# Altium schematic symbol library Regulator_Switching.SchLib: 1070 symbols (part 2 of 9)
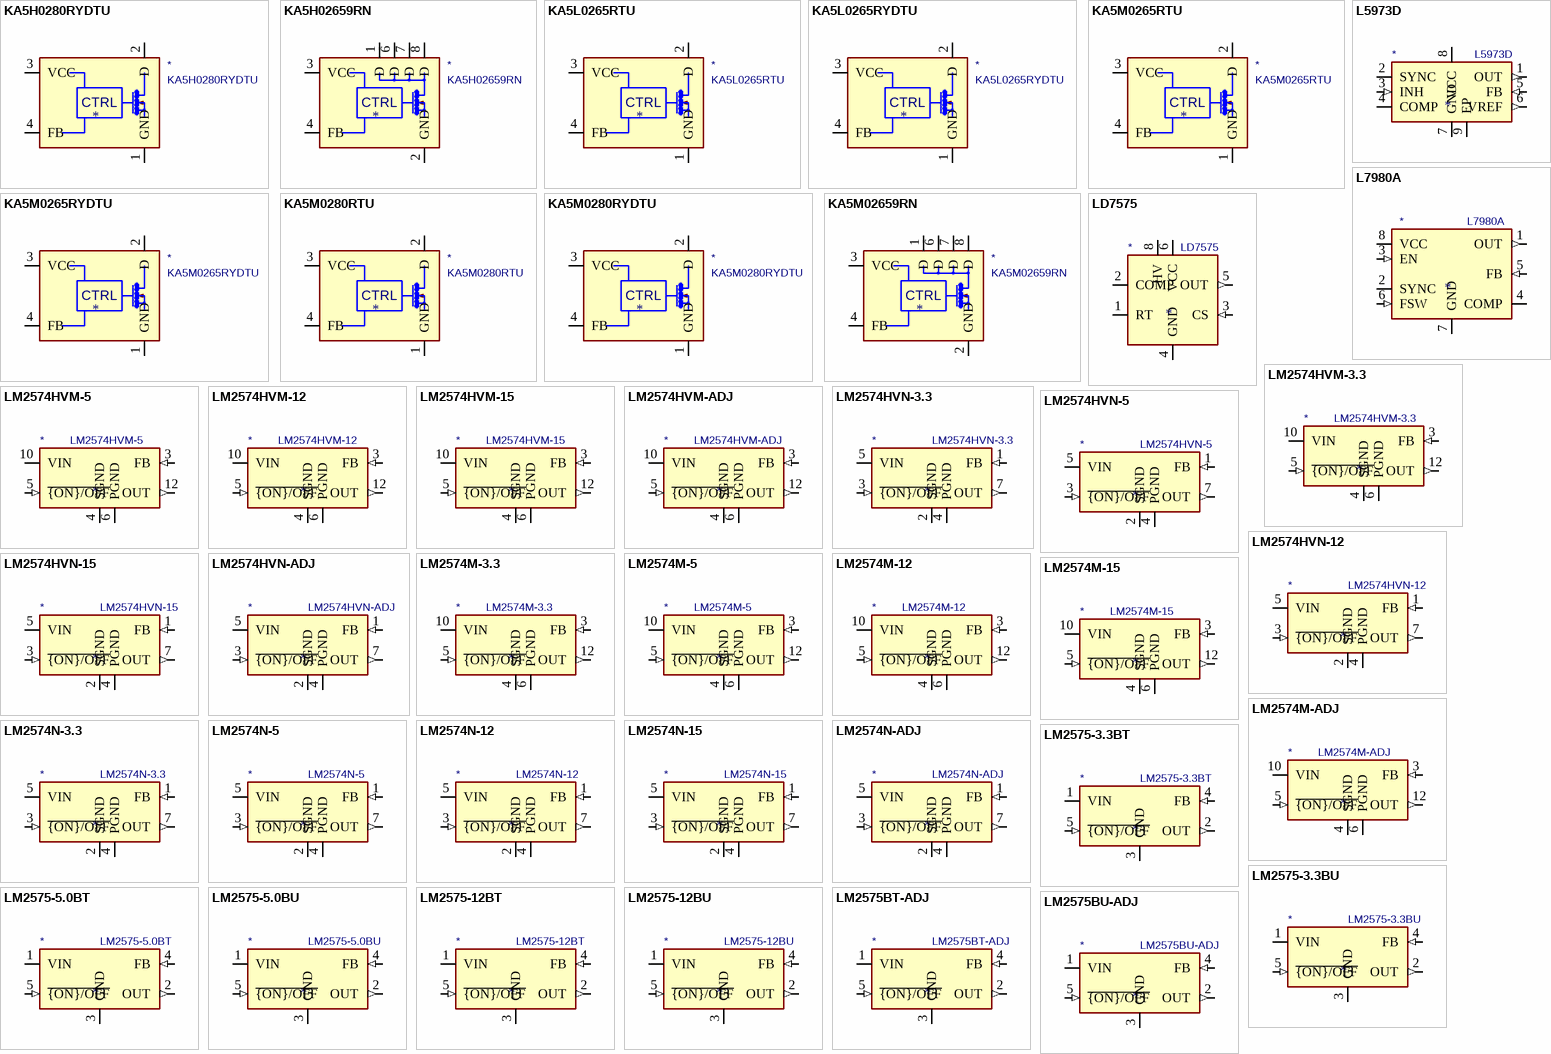
[diagram p27: symbols KA5H0280RYDTU to LM2575BU-ADJ]

## LM2574M-12
designator *  value LM2574M-12
ki_keywords: Step-Down Voltage Regulator 12V 500mA; ki_description: 12V, 0.5A SIMPLE SWITCHER® Step-Down Voltage Regulator, SO-8; ki_fp_filters: SOIC*7.5x9mm*P1.27mm*; Footprint: Package_SO:SOIC-14W_7.5x9mm_P1.27mm; Supplier: http://www.national.com/ds/LM/LM2574.pdf
footprint SOIC-14W_7.5x9mm_P1.27mm
pins: 3 FB (in), 4 SGND (power), 5 ~{{ON}/OFF} (in), 6 PGND (power), 10 VIN (power), 12 OUT (out)

## LM2574M-15
designator *  value LM2574M-15
ki_keywords: Step-Down Voltage Regulator 15V 500mA; ki_description: 15V, 0.5A SIMPLE SWITCHER® Step-Down Voltage Regulator, SO-8; ki_fp_filters: SOIC*7.5x9mm*P1.27mm*; Footprint: Package_SO:SOIC-14W_7.5x9mm_P1.27mm; Supplier: http://www.national.com/ds/LM/LM2574.pdf
footprint SOIC-14W_7.5x9mm_P1.27mm
pins: 3 FB (in), 4 SGND (power), 5 ~{{ON}/OFF} (in), 6 PGND (power), 10 VIN (power), 12 OUT (out)

## LM2574M-ADJ
designator *  value LM2574M-ADJ
ki_keywords: Step-Down Voltage Regulator Adjustable 500mA; ki_description: Adjustable Output Voltage, 0.5A SIMPLE SWITCHER® Step-Down Voltage Regulator, SO-8; ki_fp_filters: SOIC*7.5x9mm*P1.27mm*; Footprint: Package_SO:SOIC-14W_7.5x9mm_P1.27mm; Supplier: http://www.national.com/ds/LM/LM2574.pdf
footprint SOIC-14W_7.5x9mm_P1.27mm
pins: 3 FB (in), 4 SGND (power), 5 ~{{ON}/OFF} (in), 6 PGND (power), 10 VIN (power), 12 OUT (out)

## LM2574N-3.3
designator *  value LM2574N-3.3
ki_keywords: Step-Down Voltage Regulator 3.3V 500mA; ki_description: 3.3V, 0.5A SIMPLE SWITCHER® Step-Down Voltage Regulator, DIP-8; ki_fp_filters: DIP*W7.62mm*; Footprint: Package_DIP:DIP-8_W7.62mm; Supplier: http://www.national.com/ds/LM/LM2574.pdf
footprint DIP-8_W7.62mm
pins: 1 FB (in), 2 SGND (power), 3 ~{{ON}/OFF} (in), 4 PGND (power), 5 VIN (power), 6 NC (in) hidden, 7 OUT (out), 8 NC (in) hidden

## LM2574N-5
designator *  value LM2574N-5
ki_keywords: Step-Down Voltage Regulator 5V 500mA; ki_description: 5V, 0.5A SIMPLE SWITCHER® Step-Down Voltage Regulator, DIP-8; ki_fp_filters: DIP*W7.62mm*; Footprint: Package_DIP:DIP-8_W7.62mm; Supplier: http://www.national.com/ds/LM/LM2574.pdf
footprint DIP-8_W7.62mm
pins: 1 FB (in), 2 SGND (power), 3 ~{{ON}/OFF} (in), 4 PGND (power), 5 VIN (power), 6 NC (in) hidden, 7 OUT (out), 8 NC (in) hidden

## LM2574N-12
designator *  value LM2574N-12
ki_keywords: Step-Down Voltage Regulator 12V 500mA; ki_description: 12V, 0.5A SIMPLE SWITCHER® Step-Down Voltage Regulator, DIP-8; ki_fp_filters: DIP*W7.62mm*; Footprint: Package_DIP:DIP-8_W7.62mm; Supplier: http://www.national.com/ds/LM/LM2574.pdf
footprint DIP-8_W7.62mm
pins: 1 FB (in), 2 SGND (power), 3 ~{{ON}/OFF} (in), 4 PGND (power), 5 VIN (power), 6 NC (in) hidden, 7 OUT (out), 8 NC (in) hidden

## LM2574N-15
designator *  value LM2574N-15
ki_keywords: Step-Down Voltage Regulator 15V 500mA; ki_description: 15V, 0.5A SIMPLE SWITCHER® Step-Down Voltage Regulator, DIP-8; ki_fp_filters: DIP*W7.62mm*; Footprint: Package_DIP:DIP-8_W7.62mm; Supplier: http://www.national.com/ds/LM/LM2574.pdf
footprint DIP-8_W7.62mm
pins: 1 FB (in), 2 SGND (power), 3 ~{{ON}/OFF} (in), 4 PGND (power), 5 VIN (power), 6 NC (in) hidden, 7 OUT (out), 8 NC (in) hidden

## LM2574N-ADJ
designator *  value LM2574N-ADJ
ki_keywords: Step-Down Voltage Regulator Adjustable 500mA; ki_description: Adjustable Output Voltage, 0.5A SIMPLE SWITCHER® Step-Down Voltage Regulator, DIP-8; ki_fp_filters: DIP*W7.62mm*; Footprint: Package_DIP:DIP-8_W7.62mm; Supplier: http://www.national.com/ds/LM/LM2574.pdf
footprint DIP-8_W7.62mm
pins: 1 FB (in), 2 SGND (power), 3 ~{{ON}/OFF} (in), 4 PGND (power), 5 VIN (power), 6 NC (in) hidden, 7 OUT (out), 8 NC (in) hidden

## LM2575-3.3BT
designator *  value LM2575-3.3BT
ki_keywords: Buck regulator Switcher; ki_description: Fixed 3.3V 52kHz Simple 1A Buck Regulator, TO-220-5; ki_fp_filters: TO?220*; Footprint: Package_TO_SOT_THT:TO-220-5_Vertical; Supplier: http://ww1.microchip.com/downloads/en/DeviceDoc/lm2575.pdf
footprint TO-220-5_Vertical
pins: 1 VIN (power), 2 OUT (out), 3 GND (power), 4 FB (in), 5 ~{{ON}/OFF} (in)

## LM2575-3.3BU
designator *  value LM2575-3.3BU
ki_keywords: Buck regulator Switcher; ki_description: Fixed 3.3V 52kHz Simple 1A Buck Regulator, TO-263; ki_fp_filters: TO?263*; Footprint: Package_TO_SOT_SMD:TO-263-5_TabPin3; Supplier: http://ww1.microchip.com/downloads/en/DeviceDoc/lm2575.pdf
footprint TO-263-5_TabPin3
pins: 1 VIN (power), 2 OUT (out), 3 GND (power), 4 FB (in), 5 ~{{ON}/OFF} (in)

## LM2575-5.0BT
designator *  value LM2575-5.0BT
ki_keywords: Buck regulator Switcher; ki_description: Fixed 5.0V 52kHz Simple 1A Buck Regulator, TO-220-5; ki_fp_filters: TO?220*; Footprint: Package_TO_SOT_THT:TO-220-5_Vertical; Supplier: http://ww1.microchip.com/downloads/en/DeviceDoc/lm2575.pdf
footprint TO-220-5_Vertical
pins: 1 VIN (power), 2 OUT (out), 3 GND (power), 4 FB (in), 5 ~{{ON}/OFF} (in)

## LM2575-5.0BU
designator *  value LM2575-5.0BU
ki_keywords: Buck regulator Switcher; ki_description: Fixed 5.0V 52kHz Simple 1A Buck Regulator, TO-263; ki_fp_filters: TO?263*; Footprint: Package_TO_SOT_SMD:TO-263-5_TabPin3; Supplier: http://ww1.microchip.com/downloads/en/DeviceDoc/lm2575.pdf
footprint TO-263-5_TabPin3
pins: 1 VIN (power), 2 OUT (out), 3 GND (power), 4 FB (in), 5 ~{{ON}/OFF} (in)

## LM2575-12BT
designator *  value LM2575-12BT
ki_keywords: Buck regulator Switcher; ki_description: Fixed 12V 52kHz Simple 1A Buck Regulator, TO-220-5; ki_fp_filters: TO?220*; Footprint: Package_TO_SOT_THT:TO-220-5_Vertical; Supplier: http://ww1.microchip.com/downloads/en/DeviceDoc/lm2575.pdf
footprint TO-220-5_Vertical
pins: 1 VIN (power), 2 OUT (out), 3 GND (power), 4 FB (in), 5 ~{{ON}/OFF} (in)

## LM2575-12BU
designator *  value LM2575-12BU
ki_keywords: Buck regulator Switcher; ki_description: Fixed 12V 52kHz Simple 1A Buck Regulator, TO-263; ki_fp_filters: TO?263*; Footprint: Package_TO_SOT_SMD:TO-263-5_TabPin3; Supplier: http://ww1.microchip.com/downloads/en/DeviceDoc/lm2575.pdf
footprint TO-263-5_TabPin3
pins: 1 VIN (power), 2 OUT (out), 3 GND (power), 4 FB (in), 5 ~{{ON}/OFF} (in)

## LM2575BT-ADJ
designator *  value LM2575BT-ADJ
ki_keywords: Buck regulator Switcher; ki_description: Adjustable 52kHz Simple 1A Buck Regulator, TO-220-5; ki_fp_filters: TO?220*; Footprint: Package_TO_SOT_THT:TO-220-5_Vertical; Supplier: http://ww1.microchip.com/downloads/en/DeviceDoc/lm2575.pdf
footprint TO-220-5_Vertical
pins: 1 VIN (power), 2 OUT (out), 3 GND (power), 4 FB (in), 5 ~{{ON}/OFF} (in)

## LM2575BU-ADJ
designator *  value LM2575BU-ADJ
ki_keywords: Buck Regulator Switcher; ki_description: Adjustable 52kHz Simple 1A Buck Regulator, TO-263; ki_fp_filters: TO?263*; Footprint: Package_TO_SOT_SMD:TO-263-5_TabPin3; Supplier: http://ww1.microchip.com/downloads/en/DeviceDoc/lm2575.pdf
footprint TO-263-5_TabPin3
pins: 1 VIN (power), 2 OUT (out), 3 GND (power), 4 FB (in), 5 ~{{ON}/OFF} (in)

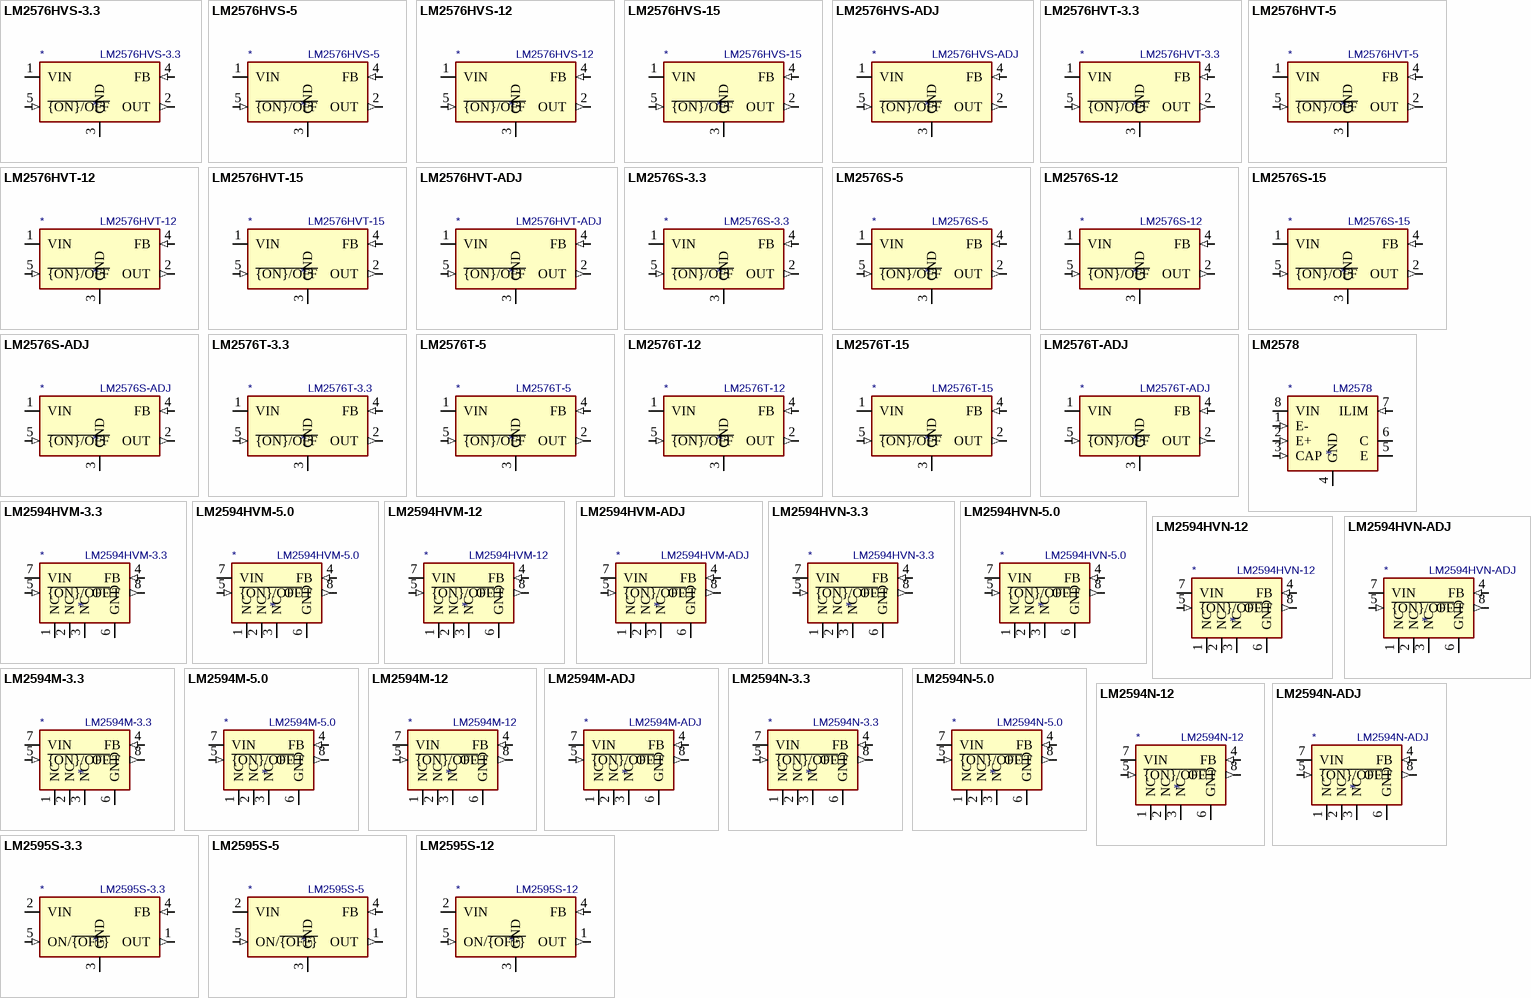
[diagram p4: symbols LM2576HVS-3.3 to LM2595S-12]

## LM2576HVS-3.3
designator *  value LM2576HVS-3.3
ki_keywords: Step-Down Voltage Regulator 3.3V 3A High Voltage; ki_description: 3.3V, 3A, SIMPLE SWITCHER® Step-Down Voltage Regulator, High Voltage Input, TO-263; ki_fp_filters: TO?263*; Footprint: Package_TO_SOT_SMD:TO-263-5_TabPin3; Supplier: http://www.ti.com/lit/ds/symlink/lm2576.pdf
footprint TO-263-5_TabPin3
pins: 1 VIN (power), 2 OUT (out), 3 GND (power), 4 FB (in), 5 ~{{ON}/OFF} (in)

## LM2576HVS-5
designator *  value LM2576HVS-5
ki_keywords: Step-Down Voltage Regulator 5V 3A High Voltage; ki_description: 5V 3A, SIMPLE SWITCHER® Step-Down Voltage Regulator, High Voltage Input, TO-263; ki_fp_filters: TO?263*; Footprint: Package_TO_SOT_SMD:TO-263-5_TabPin3; Supplier: http://www.ti.com/lit/ds/symlink/lm2576.pdf
footprint TO-263-5_TabPin3
pins: 1 VIN (power), 2 OUT (out), 3 GND (power), 4 FB (in), 5 ~{{ON}/OFF} (in)

## LM2576HVS-12
designator *  value LM2576HVS-12
ki_keywords: Step-Down Voltage Regulator 12V 3A High Voltage; ki_description: 12V, 3A SIMPLE SWITCHER® Step-Down Voltage Regulator, High Voltage Input, TO-263; ki_fp_filters: TO?263*; Footprint: Package_TO_SOT_SMD:TO-263-5_TabPin3; Supplier: http://www.ti.com/lit/ds/symlink/lm2576.pdf
footprint TO-263-5_TabPin3
pins: 1 VIN (power), 2 OUT (out), 3 GND (power), 4 FB (in), 5 ~{{ON}/OFF} (in)

## LM2576HVS-15
designator *  value LM2576HVS-15
ki_keywords: Step-Down Voltage Regulator 15V 3A High Voltage; ki_description: 15V, 3A SIMPLE SWITCHER® Step-Down Voltage Regulator, High Voltage Input, TO-263; ki_fp_filters: TO?263*; Footprint: Package_TO_SOT_SMD:TO-263-5_TabPin3; Supplier: http://www.ti.com/lit/ds/symlink/lm2576.pdf
footprint TO-263-5_TabPin3
pins: 1 VIN (power), 2 OUT (out), 3 GND (power), 4 FB (in), 5 ~{{ON}/OFF} (in)

## LM2576HVS-ADJ
designator *  value LM2576HVS-ADJ
ki_keywords: Step-Down Voltage Regulator 3A Adjustable High Voltage; ki_description: Adjustable Output Voltage, 3A SIMPLE SWITCHER® Step-Down Voltage Regulator, High Voltage Input, TO-263; ki_fp_filters: TO?263*; Footprint: Package_TO_SOT_SMD:TO-263-5_TabPin3; Supplier: http://www.ti.com/lit/ds/symlink/lm2576.pdf
footprint TO-263-5_TabPin3
pins: 1 VIN (power), 2 OUT (out), 3 GND (power), 4 FB (in), 5 ~{{ON}/OFF} (in)

## LM2576HVT-3.3
designator *  value LM2576HVT-3.3
ki_keywords: Step-Down Voltage Regulator 3.3V 3A High Voltage; ki_description: 3.3V, 3A SIMPLE SWITCHER® Step-Down Voltage Regulator, High Voltage Input, TO-220-5; ki_fp_filters: TO?220*; Footprint: Package_TO_SOT_THT:TO-220-5_Vertical; Supplier: http://www.ti.com/lit/ds/symlink/lm2576.pdf
footprint TO-220-5_Vertical
pins: 1 VIN (power), 2 OUT (out), 3 GND (power), 4 FB (in), 5 ~{{ON}/OFF} (in)

## LM2576HVT-5
designator *  value LM2576HVT-5
ki_keywords: Step-Down Voltage Regulator 5V 3A High Voltage; ki_description: 5V, 3A SIMPLE SWITCHER® Step-Down Voltage Regulator, High Voltage Input, TO-220-5; ki_fp_filters: TO?220*; Footprint: Package_TO_SOT_THT:TO-220-5_Vertical; Supplier: http://www.ti.com/lit/ds/symlink/lm2576.pdf
footprint TO-220-5_Vertical
pins: 1 VIN (power), 2 OUT (out), 3 GND (power), 4 FB (in), 5 ~{{ON}/OFF} (in)

## LM2576HVT-12
designator *  value LM2576HVT-12
ki_keywords: Step-Down Voltage Regulator 12V 3A High Voltage; ki_description: 12V, 3A SIMPLE SWITCHER® Step-Down Voltage Regulator, High Voltage Input, TO-220-5; ki_fp_filters: TO?220*; Footprint: Package_TO_SOT_THT:TO-220-5_Vertical; Supplier: http://www.ti.com/lit/ds/symlink/lm2576.pdf
footprint TO-220-5_Vertical
pins: 1 VIN (power), 2 OUT (out), 3 GND (power), 4 FB (in), 5 ~{{ON}/OFF} (in)

## LM2576HVT-15
designator *  value LM2576HVT-15
ki_keywords: Step-Down Voltage Regulator 15V 3A High Voltage; ki_description: 15V, 3A SIMPLE SWITCHER® Step-Down Voltage Regulator, High Voltage Input, TO-220-5; ki_fp_filters: TO?220*; Footprint: Package_TO_SOT_THT:TO-220-5_Vertical; Supplier: http://www.ti.com/lit/ds/symlink/lm2576.pdf
footprint TO-220-5_Vertical
pins: 1 VIN (power), 2 OUT (out), 3 GND (power), 4 FB (in), 5 ~{{ON}/OFF} (in)

## LM2576HVT-ADJ
designator *  value LM2576HVT-ADJ
ki_keywords: Step-Down Voltage Regulator 3A Adjustable High Voltage; ki_description: Adjustable Output Voltage, 3A SIMPLE SWITCHER® Step-Down Voltage Regulator, High Voltage Input, TO-220-5; ki_fp_filters: TO?220*; Footprint: Package_TO_SOT_THT:TO-220-5_Vertical; Supplier: http://www.ti.com/lit/ds/symlink/lm2576.pdf
footprint TO-220-5_Vertical
pins: 1 VIN (power), 2 OUT (out), 3 GND (power), 4 FB (in), 5 ~{{ON}/OFF} (in)

## LM2576S-3.3
designator *  value LM2576S-3.3
ki_keywords: Step-Down Voltage Regulator 3.3V 3A; ki_description: 3.3V, 3A SIMPLE SWITCHER® Step-Down Voltage Regulator, TO-263; ki_fp_filters: TO?263*; Footprint: Package_TO_SOT_SMD:TO-263-5_TabPin3; Supplier: http://www.ti.com/lit/ds/symlink/lm2576.pdf
footprint TO-263-5_TabPin3
pins: 1 VIN (power), 2 OUT (out), 3 GND (power), 4 FB (in), 5 ~{{ON}/OFF} (in)

## LM2576S-5
designator *  value LM2576S-5
ki_keywords: Step-Down Voltage Regulator 5V 3A; ki_description: 5V, 3A SIMPLE SWITCHER® Step-Down Voltage Regulator, TO-263; ki_fp_filters: TO?263*; Footprint: Package_TO_SOT_SMD:TO-263-5_TabPin3; Supplier: http://www.ti.com/lit/ds/symlink/lm2576.pdf
footprint TO-263-5_TabPin3
pins: 1 VIN (power), 2 OUT (out), 3 GND (power), 4 FB (in), 5 ~{{ON}/OFF} (in)

## LM2576S-12
designator *  value LM2576S-12
ki_keywords: Step-Down Voltage Regulator 12V 3A; ki_description: 12V, 3A SIMPLE SWITCHER® Step-Down Voltage Regulator, TO-263; ki_fp_filters: TO?263*; Footprint: Package_TO_SOT_SMD:TO-263-5_TabPin3; Supplier: http://www.ti.com/lit/ds/symlink/lm2576.pdf
footprint TO-263-5_TabPin3
pins: 1 VIN (power), 2 OUT (out), 3 GND (power), 4 FB (in), 5 ~{{ON}/OFF} (in)

## LM2576S-15
designator *  value LM2576S-15
ki_keywords: Step-Down Voltage Regulator 15V 3A; ki_description: 15V, 3A SIMPLE SWITCHER® Step-Down Voltage Regulator, TO-263; ki_fp_filters: TO?263*; Footprint: Package_TO_SOT_SMD:TO-263-5_TabPin3; Supplier: http://www.ti.com/lit/ds/symlink/lm2576.pdf
footprint TO-263-5_TabPin3
pins: 1 VIN (power), 2 OUT (out), 3 GND (power), 4 FB (in), 5 ~{{ON}/OFF} (in)

## LM2576S-ADJ
designator *  value LM2576S-ADJ
ki_keywords: Step-Down Voltage Regulator 3A Adjustable; ki_description: Adjustable Output Voltage, 3A SIMPLE SWITCHER® Step-Down Voltage Regulator, TO-263; ki_fp_filters: TO?263*; Footprint: Package_TO_SOT_SMD:TO-263-5_TabPin3; Supplier: http://www.ti.com/lit/ds/symlink/lm2576.pdf
footprint TO-263-5_TabPin3
pins: 1 VIN (power), 2 OUT (out), 3 GND (power), 4 FB (in), 5 ~{{ON}/OFF} (in)

## LM2576T-3.3
designator *  value LM2576T-3.3
ki_keywords: Step-Down Voltage Regulator 3.3V 3A; ki_description: 3.3V, 3A SIMPLE SWITCHER® Step-Down Voltage Regulator, TO-220-5; ki_fp_filters: TO?220*; Footprint: Package_TO_SOT_THT:TO-220-5_Vertical; Supplier: http://www.ti.com/lit/ds/symlink/lm2576.pdf
footprint TO-220-5_Vertical
pins: 1 VIN (power), 2 OUT (out), 3 GND (power), 4 FB (in), 5 ~{{ON}/OFF} (in)

## LM2576T-5
designator *  value LM2576T-5
ki_keywords: Step-Down Voltage Regulator 5V 3A; ki_description: 5V, 3A SIMPLE SWITCHER® Step-Down Voltage Regulator, TO-220-5; ki_fp_filters: TO?220*; Footprint: Package_TO_SOT_THT:TO-220-5_Vertical; Supplier: http://www.ti.com/lit/ds/symlink/lm2576.pdf
footprint TO-220-5_Vertical
pins: 1 VIN (power), 2 OUT (out), 3 GND (power), 4 FB (in), 5 ~{{ON}/OFF} (in)

## LM2576T-12
designator *  value LM2576T-12
ki_keywords: Step-Down Voltage Regulator 12V 3A; ki_description: 12V, 3A SIMPLE SWITCHER® Step-Down Voltage Regulator, TO-220-5; ki_fp_filters: TO?220*; Footprint: Package_TO_SOT_THT:TO-220-5_Vertical; Supplier: http://www.ti.com/lit/ds/symlink/lm2576.pdf
footprint TO-220-5_Vertical
pins: 1 VIN (power), 2 OUT (out), 3 GND (power), 4 FB (in), 5 ~{{ON}/OFF} (in)

## LM2576T-15
designator *  value LM2576T-15
ki_keywords: Step-Down Voltage Regulator 15V 3A; ki_description: 15V, 3A SIMPLE SWITCHER® Step-Down Voltage Regulator, TO-220-5; ki_fp_filters: TO?220*; Footprint: Package_TO_SOT_THT:TO-220-5_Vertical; Supplier: http://www.ti.com/lit/ds/symlink/lm2576.pdf
footprint TO-220-5_Vertical
pins: 1 VIN (power), 2 OUT (out), 3 GND (power), 4 FB (in), 5 ~{{ON}/OFF} (in)

## LM2576T-ADJ
designator *  value LM2576T-ADJ
ki_keywords: Step-Down Voltage Regulator 3A Adjustable; ki_description: Adjustable Output Voltage, 3A SIMPLE SWITCHER® Step-Down Voltage Regulator, TO-220-5; ki_fp_filters: TO?220*; Footprint: Package_TO_SOT_THT:TO-220-5_Vertical; Supplier: http://www.ti.com/lit/ds/symlink/lm2576.pdf
footprint TO-220-5_Vertical
pins: 1 VIN (power), 2 OUT (out), 3 GND (power), 4 FB (in), 5 ~{{ON}/OFF} (in)

## LM2578
designator *  value LM2578
ki_keywords: switching regulator; ki_description: 750mA, Switching Regulator, adjustable output voltage, DIP-8/SOIC-8; ki_fp_filters: DIP*W7.62mm* SOIC*3.9x4.9mm*; Supplier: http://www.ti.com/lit/ds/symlink/lm3578a.pdf
pins: 1 E- (in), 2 E+ (in), 3 CAP (in), 4 GND (power), 5 E (oe), 6 C (oc), 7 ILIM (in), 8 VIN (power)

## LM2594HVM-3.3
designator *  value LM2594HVM-3.3
ki_keywords: buck converter regulator step-down voltage simple switcher fixed; ki_description: 3.3V, 0.5A SIMPLE SWITCHER® Step-Down Voltage Regulator, Maximum VIN 60V, SOIC-8; ki_fp_filters: SOIC*3.9x4.9mm*; Footprint: Package_SO:SOIC-8_3.9x4.9mm_P1.27mm; Supplier: http://www.ti.com/lit/ds/symlink/lm2594.pdf
footprint SOIC-8_3.9x4.9mm_P1.27mm
pins: 1 NC, 2 NC, 3 NC, 4 FB (in), 5 ~{{ON}/OFF} (in), 6 GND (power), 7 VIN (power), 8 OUT (out)

## LM2594HVM-5.0
designator *  value LM2594HVM-5.0
ki_keywords: buck converter regulator step-down voltage simple switcher fixed; ki_description: 5.0V, 0.5A SIMPLE SWITCHER® Step-Down Voltage Regulator, Maximum VIN 60V, SOIC-8; ki_fp_filters: SOIC*3.9x4.9mm*; Footprint: Package_SO:SOIC-8_3.9x4.9mm_P1.27mm; Supplier: http://www.ti.com/lit/ds/symlink/lm2594.pdf
footprint SOIC-8_3.9x4.9mm_P1.27mm
pins: 1 NC, 2 NC, 3 NC, 4 FB (in), 5 ~{{ON}/OFF} (in), 6 GND (power), 7 VIN (power), 8 OUT (out)

## LM2594HVM-12
designator *  value LM2594HVM-12
ki_keywords: buck converter regulator step-down voltage simple switcher fixed; ki_description: 12V, 0.5A SIMPLE SWITCHER® Step-Down Voltage Regulator, Maximum VIN 60V, SOIC-8; ki_fp_filters: SOIC*3.9x4.9mm*; Footprint: Package_SO:SOIC-8_3.9x4.9mm_P1.27mm; Supplier: http://www.ti.com/lit/ds/symlink/lm2594.pdf
footprint SOIC-8_3.9x4.9mm_P1.27mm
pins: 1 NC, 2 NC, 3 NC, 4 FB (in), 5 ~{{ON}/OFF} (in), 6 GND (power), 7 VIN (power), 8 OUT (out)

## LM2594HVM-ADJ
designator *  value LM2594HVM-ADJ
ki_keywords: buck converter regulator step-down voltage simple switcher adjustable; ki_description: Adjustable Output Voltage, 0.5A SIMPLE SWITCHER® Step-Down Voltage Regulator, Maximum VIN 60V, SOIC-8; ki_fp_filters: SOIC*3.9x4.9mm*; Footprint: Package_SO:SOIC-8_3.9x4.9mm_P1.27mm; Supplier: http://www.ti.com/lit/ds/symlink/lm2594.pdf
footprint SOIC-8_3.9x4.9mm_P1.27mm
pins: 1 NC, 2 NC, 3 NC, 4 FB (in), 5 ~{{ON}/OFF} (in), 6 GND (power), 7 VIN (power), 8 OUT (out)

## LM2594HVN-3.3
designator *  value LM2594HVN-3.3
ki_keywords: buck converter regulator step-down voltage simple switcher fixed; ki_description: 3.3V, 0.5A SIMPLE SWITCHER® Step-Down Voltage Regulator, Maximum VIN 60V, DIP-8; ki_fp_filters: DIP*W7.62mm*; Footprint: Package_DIP:DIP-8_W7.62mm; Supplier: http://www.ti.com/lit/ds/symlink/lm2594.pdf
footprint DIP-8_W7.62mm
pins: 1 NC, 2 NC, 3 NC, 4 FB (in), 5 ~{{ON}/OFF} (in), 6 GND (power), 7 VIN (power), 8 OUT (out)

## LM2594HVN-5.0
designator *  value LM2594HVN-5.0
ki_keywords: buck converter regulator step-down voltage simple switcher fixed; ki_description: 5.0V, 0.5A SIMPLE SWITCHER® Step-Down Voltage Regulator, Maximum VIN 60V, DIP-8; ki_fp_filters: DIP*W7.62mm*; Footprint: Package_DIP:DIP-8_W7.62mm; Supplier: http://www.ti.com/lit/ds/symlink/lm2594.pdf
footprint DIP-8_W7.62mm
pins: 1 NC, 2 NC, 3 NC, 4 FB (in), 5 ~{{ON}/OFF} (in), 6 GND (power), 7 VIN (power), 8 OUT (out)

## LM2594HVN-12
designator *  value LM2594HVN-12
ki_keywords: buck converter regulator step-down voltage simple switcher fixed; ki_description: 12V, 0.5A SIMPLE SWITCHER® Step-Down Voltage Regulator, Maximum VIN 60V, DIP-8; ki_fp_filters: DIP*W7.62mm*; Footprint: Package_DIP:DIP-8_W7.62mm; Supplier: http://www.ti.com/lit/ds/symlink/lm2594.pdf
footprint DIP-8_W7.62mm
pins: 1 NC, 2 NC, 3 NC, 4 FB (in), 5 ~{{ON}/OFF} (in), 6 GND (power), 7 VIN (power), 8 OUT (out)

## LM2594HVN-ADJ
designator *  value LM2594HVN-ADJ
ki_keywords: buck converter regulator step-down voltage simple switcher adjustable; ki_description: Adjustable Output Voltage, 0.5A SIMPLE SWITCHER® Step-Down Voltage Regulator, Maximum VIN 60V, DIP-8; ki_fp_filters: DIP*W7.62mm*; Footprint: Package_DIP:DIP-8_W7.62mm; Supplier: http://www.ti.com/lit/ds/symlink/lm2594.pdf
footprint DIP-8_W7.62mm
pins: 1 NC, 2 NC, 3 NC, 4 FB (in), 5 ~{{ON}/OFF} (in), 6 GND (power), 7 VIN (power), 8 OUT (out)

## LM2594M-3.3
designator *  value LM2594M-3.3
ki_keywords: buck converter regulator step-down voltage simple switcher fixed; ki_description: 3.3V, 0.5A SIMPLE SWITCHER® Step-Down Voltage Regulator, Maximum VIN 45V, SOIC-8; ki_fp_filters: SOIC*3.9x4.9mm*; Footprint: Package_SO:SOIC-8_3.9x4.9mm_P1.27mm; Supplier: http://www.ti.com/lit/ds/symlink/lm2594.pdf
footprint SOIC-8_3.9x4.9mm_P1.27mm
pins: 1 NC, 2 NC, 3 NC, 4 FB (in), 5 ~{{ON}/OFF} (in), 6 GND (power), 7 VIN (power), 8 OUT (out)

## LM2594M-5.0
designator *  value LM2594M-5.0
ki_keywords: buck converter regulator step-down voltage simple switcher fixed; ki_description: 5.0V, 0.5A SIMPLE SWITCHER® Step-Down Voltage Regulator, Maximum VIN 45V, SOIC-8; ki_fp_filters: SOIC*3.9x4.9mm*; Footprint: Package_SO:SOIC-8_3.9x4.9mm_P1.27mm; Supplier: http://www.ti.com/lit/ds/symlink/lm2594.pdf
footprint SOIC-8_3.9x4.9mm_P1.27mm
pins: 1 NC, 2 NC, 3 NC, 4 FB (in), 5 ~{{ON}/OFF} (in), 6 GND (power), 7 VIN (power), 8 OUT (out)

## LM2594M-12
designator *  value LM2594M-12
ki_keywords: buck converter regulator step-down voltage simple switcher fixed; ki_description: 12V, 0.5A SIMPLE SWITCHER® Step-Down Voltage Regulator, Maximum VIN 45V, SOIC-8; ki_fp_filters: SOIC*3.9x4.9mm*; Footprint: Package_SO:SOIC-8_3.9x4.9mm_P1.27mm; Supplier: http://www.ti.com/lit/ds/symlink/lm2594.pdf
footprint SOIC-8_3.9x4.9mm_P1.27mm
pins: 1 NC, 2 NC, 3 NC, 4 FB (in), 5 ~{{ON}/OFF} (in), 6 GND (power), 7 VIN (power), 8 OUT (out)

## LM2594M-ADJ
designator *  value LM2594M-ADJ
ki_keywords: buck converter regulator step-down voltage simple switcher adjustable; ki_description: Adjustable Output Voltage, 0.5A SIMPLE SWITCHER® Step-Down Voltage Regulator, Maximum VIN 45V, SOIC-8; ki_fp_filters: SOIC*3.9x4.9mm*; Footprint: Package_SO:SOIC-8_3.9x4.9mm_P1.27mm; Supplier: http://www.ti.com/lit/ds/symlink/lm2594.pdf
footprint SOIC-8_3.9x4.9mm_P1.27mm
pins: 1 NC, 2 NC, 3 NC, 4 FB (in), 5 ~{{ON}/OFF} (in), 6 GND (power), 7 VIN (power), 8 OUT (out)

## LM2594N-3.3
designator *  value LM2594N-3.3
ki_keywords: buck converter regulator step-down voltage simple switcher fixed; ki_description: 3.3V, 0.5A SIMPLE SWITCHER® Step-Down Voltage Regulator, Maximum VIN 45V, DIP-8; ki_fp_filters: DIP*W7.62mm*; Footprint: Package_DIP:DIP-8_W7.62mm; Supplier: http://www.ti.com/lit/ds/symlink/lm2594.pdf
footprint DIP-8_W7.62mm
pins: 1 NC, 2 NC, 3 NC, 4 FB (in), 5 ~{{ON}/OFF} (in), 6 GND (power), 7 VIN (power), 8 OUT (out)

## LM2594N-5.0
designator *  value LM2594N-5.0
ki_keywords: buck converter regulator step-down voltage simple switcher fixed; ki_description: 5.0V, 0.5A SIMPLE SWITCHER® Step-Down Voltage Regulator, Maximum VIN 45V, DIP-8; ki_fp_filters: DIP*W7.62mm*; Footprint: Package_DIP:DIP-8_W7.62mm; Supplier: http://www.ti.com/lit/ds/symlink/lm2594.pdf
footprint DIP-8_W7.62mm
pins: 1 NC, 2 NC, 3 NC, 4 FB (in), 5 ~{{ON}/OFF} (in), 6 GND (power), 7 VIN (power), 8 OUT (out)

## LM2594N-12
designator *  value LM2594N-12
ki_keywords: buck converter regulator step-down voltage simple switcher fixed; ki_description: 12V, 0.5A SIMPLE SWITCHER® Step-Down Voltage Regulator, Maximum VIN 45V, DIP-8; ki_fp_filters: DIP*W7.62mm*; Footprint: Package_DIP:DIP-8_W7.62mm; Supplier: http://www.ti.com/lit/ds/symlink/lm2594.pdf
footprint DIP-8_W7.62mm
pins: 1 NC, 2 NC, 3 NC, 4 FB (in), 5 ~{{ON}/OFF} (in), 6 GND (power), 7 VIN (power), 8 OUT (out)

## LM2594N-ADJ
designator *  value LM2594N-ADJ
ki_keywords: buck converter regulator step-down voltage simple switcher adjustable; ki_description: Adjustable Output Voltage, 0.5A SIMPLE SWITCHER® Step-Down Voltage Regulator, Maximum VIN 45V, DIP-8; ki_fp_filters: DIP*W7.62mm*; Footprint: Package_DIP:DIP-8_W7.62mm; Supplier: http://www.ti.com/lit/ds/symlink/lm2594.pdf
footprint DIP-8_W7.62mm
pins: 1 NC, 2 NC, 3 NC, 4 FB (in), 5 ~{{ON}/OFF} (in), 6 GND (power), 7 VIN (power), 8 OUT (out)

## LM2595S-3.3
designator *  value LM2595S-3.3
ki_keywords: Step-Down Voltage Regulator 3.3V 1A; ki_description: 3.3V, 1A Step-Down Voltage Regulator, TO-263-5; ki_fp_filters: TO?263*; Footprint: Package_TO_SOT_SMD:TO-263-5_TabPin3; Supplier: http://www.ti.com.cn/cn/lit/ds/symlink/lm2595.pdf
footprint TO-263-5_TabPin3
pins: 1 OUT (out), 2 VIN (power), 3 GND (power), 4 FB (in), 5 ON/~{{OFF}} (in)

## LM2595S-5
designator *  value LM2595S-5
ki_keywords: Step-Down Voltage Regulator 5V 1A; ki_description: 5V, 1A Step-Down Voltage Regulator, TO-263-5; ki_fp_filters: TO?263*; Footprint: Package_TO_SOT_SMD:TO-263-5_TabPin3; Supplier: http://www.ti.com.cn/cn/lit/ds/symlink/lm2595.pdf
footprint TO-263-5_TabPin3
pins: 1 OUT (out), 2 VIN (power), 3 GND (power), 4 FB (in), 5 ON/~{{OFF}} (in)

## LM2595S-12
designator *  value LM2595S-12
ki_keywords: Step-Down Voltage Regulator 12V 1A; ki_description: 12V, 1A Step-Down Voltage Regulator, TO-263-5; ki_fp_filters: TO?263*; Footprint: Package_TO_SOT_SMD:TO-263-5_TabPin3; Supplier: http://www.ti.com.cn/cn/lit/ds/symlink/lm2595.pdf
footprint TO-263-5_TabPin3
pins: 1 OUT (out), 2 VIN (power), 3 GND (power), 4 FB (in), 5 ON/~{{OFF}} (in)

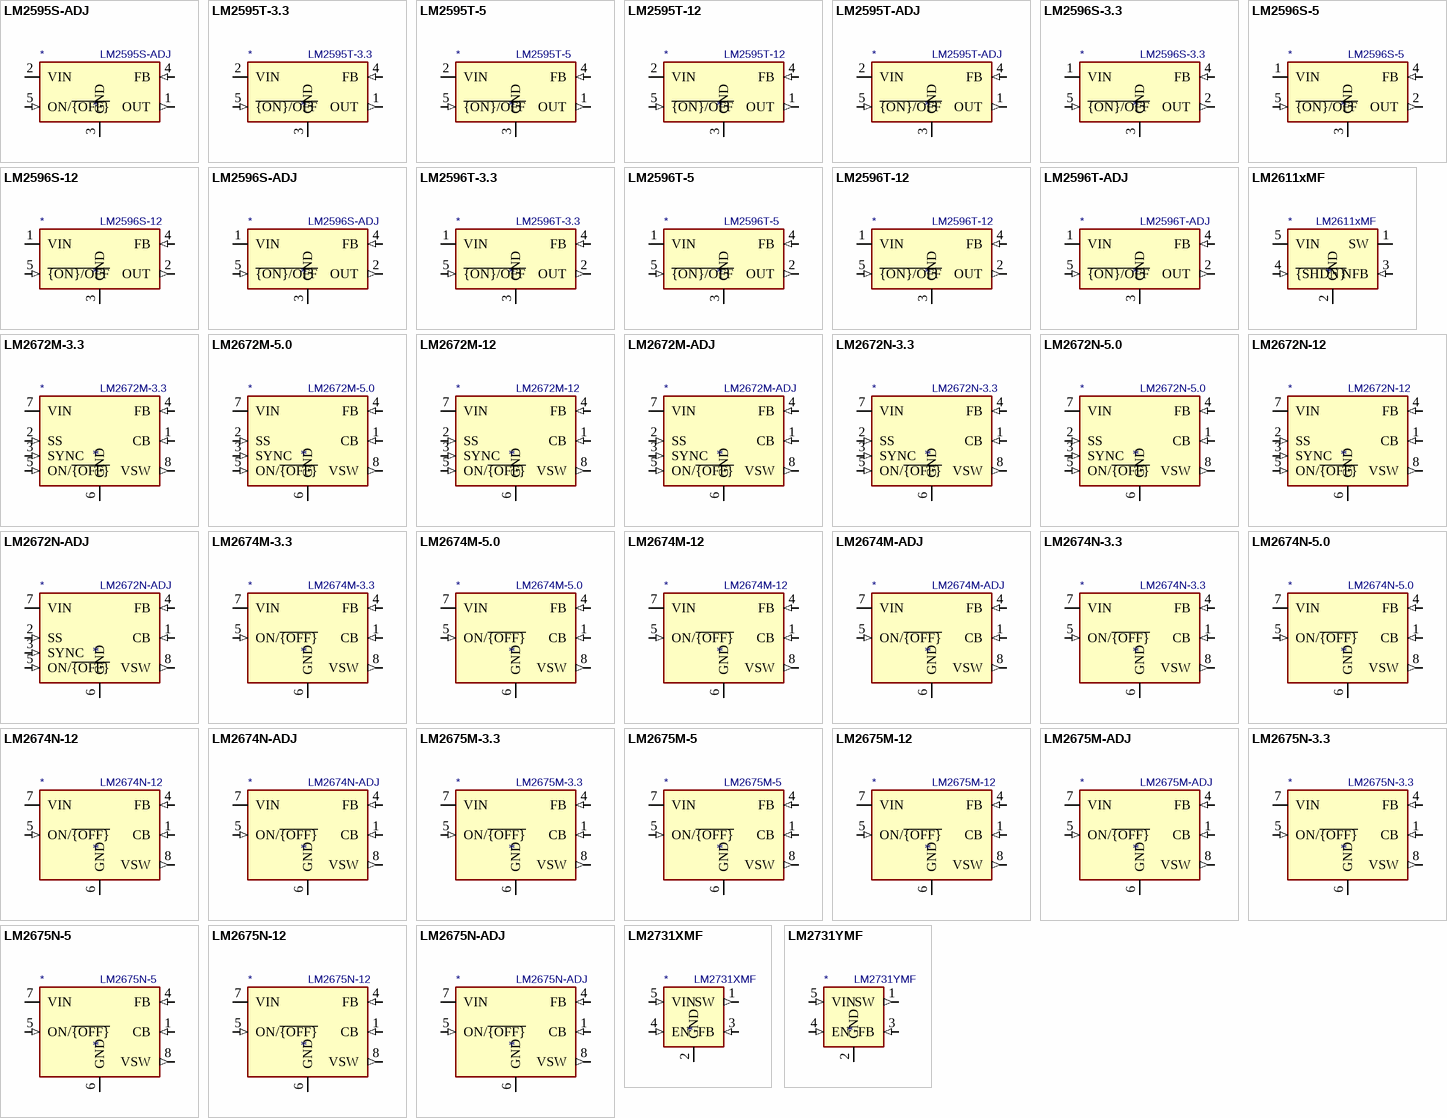
[diagram p5: symbols LM2595S-ADJ to LM2731YMF]

## LM2595S-ADJ
designator *  value LM2595S-ADJ
ki_keywords: Step-Down Voltage Regulator 1A Adjustable; ki_description: Adjustable Output 1A Step-Down Voltage Regulator, TO-263-5; ki_fp_filters: TO?263*; Footprint: Package_TO_SOT_SMD:TO-263-5_TabPin3; Supplier: http://www.ti.com.cn/cn/lit/ds/symlink/lm2595.pdf
footprint TO-263-5_TabPin3
pins: 1 OUT (out), 2 VIN (power), 3 GND (power), 4 FB (in), 5 ON/~{{OFF}} (in)

## LM2595T-3.3
designator *  value LM2595T-3.3
ki_keywords: Step-Down Voltage Regulator 3.3V 1A; ki_description: 3.3V, 1A Step-Down Voltage Regulator, TO-220-5; ki_fp_filters: TO?220*; Footprint: Package_TO_SOT_THT:TO-220-5_P3.4x3.7mm_StaggerOdd_Lead3.8mm_Vertical; Supplier: http://www.ti.com.cn/cn/lit/ds/symlink/lm2595.pdf
footprint TO-220-5_P3.4x3.7mm_StaggerOdd_Lead3.8mm_Vertical
pins: 1 OUT (out), 2 VIN (power), 3 GND (power), 4 FB (in), 5 ~{{ON}/OFF} (in)

## LM2595T-5
designator *  value LM2595T-5
ki_keywords: Step-Down Voltage Regulator 5V 1A; ki_description: 5V, 1A Step-Down Voltage Regulator, TO-220-5; ki_fp_filters: TO?220*; Footprint: Package_TO_SOT_THT:TO-220-5_P3.4x3.7mm_StaggerOdd_Lead3.8mm_Vertical; Supplier: http://www.ti.com.cn/cn/lit/ds/symlink/lm2595.pdf
footprint TO-220-5_P3.4x3.7mm_StaggerOdd_Lead3.8mm_Vertical
pins: 1 OUT (out), 2 VIN (power), 3 GND (power), 4 FB (in), 5 ~{{ON}/OFF} (in)

## LM2595T-12
designator *  value LM2595T-12
ki_keywords: Step-Down Voltage Regulator 12V 1A; ki_description: 12V, 1A Step-Down Voltage Regulator, TO-220-5; ki_fp_filters: TO?220*; Footprint: Package_TO_SOT_THT:TO-220-5_P3.4x3.7mm_StaggerOdd_Lead3.8mm_Vertical; Supplier: http://www.ti.com.cn/cn/lit/ds/symlink/lm2595.pdf
footprint TO-220-5_P3.4x3.7mm_StaggerOdd_Lead3.8mm_Vertical
pins: 1 OUT (out), 2 VIN (power), 3 GND (power), 4 FB (in), 5 ~{{ON}/OFF} (in)

## LM2595T-ADJ
designator *  value LM2595T-ADJ
ki_keywords: Step-Down Voltage Regulator 1A Adjustable; ki_description: Adjustable Output 1A Step-Down Voltage Regulator, TO-220-5; ki_fp_filters: TO?220*; Footprint: Package_TO_SOT_THT:TO-220-5_P3.4x3.7mm_StaggerOdd_Lead3.8mm_Vertical; Supplier: http://www.ti.com.cn/cn/lit/ds/symlink/lm2595.pdf
footprint TO-220-5_P3.4x3.7mm_StaggerOdd_Lead3.8mm_Vertical
pins: 1 OUT (out), 2 VIN (power), 3 GND (power), 4 FB (in), 5 ~{{ON}/OFF} (in)

## LM2596S-3.3
designator *  value LM2596S-3.3
ki_keywords: Step-Down Voltage Regulator 3.3V 3A; ki_description: 3.3V 3A Step-Down Voltage Regulator, TO-263; ki_fp_filters: TO?263*; Footprint: Package_TO_SOT_SMD:TO-263-5_TabPin3; Supplier: http://www.ti.com/lit/ds/symlink/lm2596.pdf
footprint TO-263-5_TabPin3
pins: 1 VIN (power), 2 OUT (out), 3 GND (power), 4 FB (in), 5 ~{{ON}/OFF} (in)

## LM2596S-5
designator *  value LM2596S-5
ki_keywords: Step-Down Voltage Regulator 5V 3A; ki_description: 5V 3A Step-Down Voltage Regulator, TO-263; ki_fp_filters: TO?263*; Footprint: Package_TO_SOT_SMD:TO-263-5_TabPin3; Supplier: http://www.ti.com/lit/ds/symlink/lm2596.pdf
footprint TO-263-5_TabPin3
pins: 1 VIN (power), 2 OUT (out), 3 GND (power), 4 FB (in), 5 ~{{ON}/OFF} (in)

## LM2596S-12
designator *  value LM2596S-12
ki_keywords: Step-Down Voltage Regulator 12V 3A; ki_description: 12V 3A Step-Down Voltage Regulator, TO-263; ki_fp_filters: TO?263*; Footprint: Package_TO_SOT_SMD:TO-263-5_TabPin3; Supplier: http://www.ti.com/lit/ds/symlink/lm2596.pdf
footprint TO-263-5_TabPin3
pins: 1 VIN (power), 2 OUT (out), 3 GND (power), 4 FB (in), 5 ~{{ON}/OFF} (in)

## LM2596S-ADJ
designator *  value LM2596S-ADJ
ki_keywords: Step-Down Voltage Regulator Adjustable 3A; ki_description: Adjustable 3A Step-Down Voltage Regulator, TO-263; ki_fp_filters: TO?263*; Footprint: Package_TO_SOT_SMD:TO-263-5_TabPin3; Supplier: http://www.ti.com/lit/ds/symlink/lm2596.pdf
footprint TO-263-5_TabPin3
pins: 1 VIN (power), 2 OUT (out), 3 GND (power), 4 FB (in), 5 ~{{ON}/OFF} (in)

## LM2596T-3.3
designator *  value LM2596T-3.3
ki_keywords: Step-Down Voltage Regulator 3.3V 3A; ki_description: 3.3V 3A 150kHz Step-Down Voltage Regulator, TO-220; ki_fp_filters: TO?220*; Footprint: Package_TO_SOT_THT:TO-220-5_P3.4x3.7mm_StaggerOdd_Lead3.8mm_Vertical; Supplier: http://www.ti.com/lit/ds/symlink/lm2596.pdf
footprint TO-220-5_P3.4x3.7mm_StaggerOdd_Lead3.8mm_Vertical
pins: 1 VIN (power), 2 OUT (out), 3 GND (power), 4 FB (in), 5 ~{{ON}/OFF} (in)

## LM2596T-5
designator *  value LM2596T-5
ki_keywords: Step-Down Voltage Regulator 5V 3A; ki_description: 5V 3A 150kHz Step-Down Voltage Regulator, TO-220; ki_fp_filters: TO?220*; Footprint: Package_TO_SOT_THT:TO-220-5_P3.4x3.7mm_StaggerOdd_Lead3.8mm_Vertical; Supplier: http://www.ti.com/lit/ds/symlink/lm2596.pdf
footprint TO-220-5_P3.4x3.7mm_StaggerOdd_Lead3.8mm_Vertical
pins: 1 VIN (power), 2 OUT (out), 3 GND (power), 4 FB (in), 5 ~{{ON}/OFF} (in)

## LM2596T-12
designator *  value LM2596T-12
ki_keywords: Step-Down Voltage Regulator 12V 3A; ki_description: 12V 3A 150kHz Step-Down Voltage Regulator, TO-220; ki_fp_filters: TO?220*; Footprint: Package_TO_SOT_THT:TO-220-5_P3.4x3.7mm_StaggerOdd_Lead3.8mm_Vertical; Supplier: http://www.ti.com/lit/ds/symlink/lm2596.pdf
footprint TO-220-5_P3.4x3.7mm_StaggerOdd_Lead3.8mm_Vertical
pins: 1 VIN (power), 2 OUT (out), 3 GND (power), 4 FB (in), 5 ~{{ON}/OFF} (in)

## LM2596T-ADJ
designator *  value LM2596T-ADJ
ki_keywords: Step-Down Voltage Regulator Adjustable 3A; ki_description: Adjustable 3A 150kHz Step-Down Voltage Regulator, TO-220; ki_fp_filters: TO?220*; Footprint: Package_TO_SOT_THT:TO-220-5_P3.4x3.7mm_StaggerOdd_Lead3.8mm_Vertical; Supplier: http://www.ti.com/lit/ds/symlink/lm2596.pdf
footprint TO-220-5_P3.4x3.7mm_StaggerOdd_Lead3.8mm_Vertical
pins: 1 VIN (power), 2 OUT (out), 3 GND (power), 4 FB (in), 5 ~{{ON}/OFF} (in)

## LM2611xMF
designator *  value LM2611xMF
ki_keywords: switched converter inverter PWM; ki_description: 1.4MHz Cuk Converter, SOT-23-5; ki_fp_filters: SOT?23*; Footprint: Package_TO_SOT_SMD:SOT-23-5; Supplier: https://www.ti.com/lit/ds/symlink/lm2611.pdf
footprint SOT-23-5
pins: 1 SW (oc), 2 GND (power), 3 NFB (in), 4 ~{{SHDN}} (in), 5 VIN (power)

## LM2672M-3.3
designator *  value LM2672M-3.3
ki_keywords: Step-Down Voltage Regulator 3.3V 1A; ki_description: 3.3V, 1A Step-Down Voltage Regulator, SO-8; ki_fp_filters: SOIC*3.9x4.9mm*P1.27mm*; Footprint: Package_SO:SOIC-8_3.9x4.9mm_P1.27mm; Supplier: http://www.ti.com/lit/ds/symlink/lm2672.pdf
footprint SOIC-8_3.9x4.9mm_P1.27mm
pins: 1 CB (in), 2 SS (in), 3 SYNC (in), 4 FB (in), 5 ON/~{{OFF}} (in), 6 GND (power), 7 VIN (power), 8 VSW (out)

## LM2672M-5.0
designator *  value LM2672M-5.0
ki_keywords: Step-Down Voltage Regulator 5V 1A; ki_description: 5V, 1A Step-Down Voltage Regulator, SO-8; ki_fp_filters: SOIC*3.9x4.9mm*P1.27mm*; Footprint: Package_SO:SOIC-8_3.9x4.9mm_P1.27mm; Supplier: http://www.ti.com/lit/ds/symlink/lm2672.pdf
footprint SOIC-8_3.9x4.9mm_P1.27mm
pins: 1 CB (in), 2 SS (in), 3 SYNC (in), 4 FB (in), 5 ON/~{{OFF}} (in), 6 GND (power), 7 VIN (power), 8 VSW (out)